# Altium footprint library Hare_Library.PcbLib: 252 footprints (part 5 of 16)
Each footprint in its own frame and in the unit in brackets; x right, y up, seen from the top. Pads: shape width x height; smd on the part's side, far side on the other; paste and mask are expansions set on the pad; w line width, h text height; cw(c..) or ccw(c..) is an arc to the next point about the centre after c.
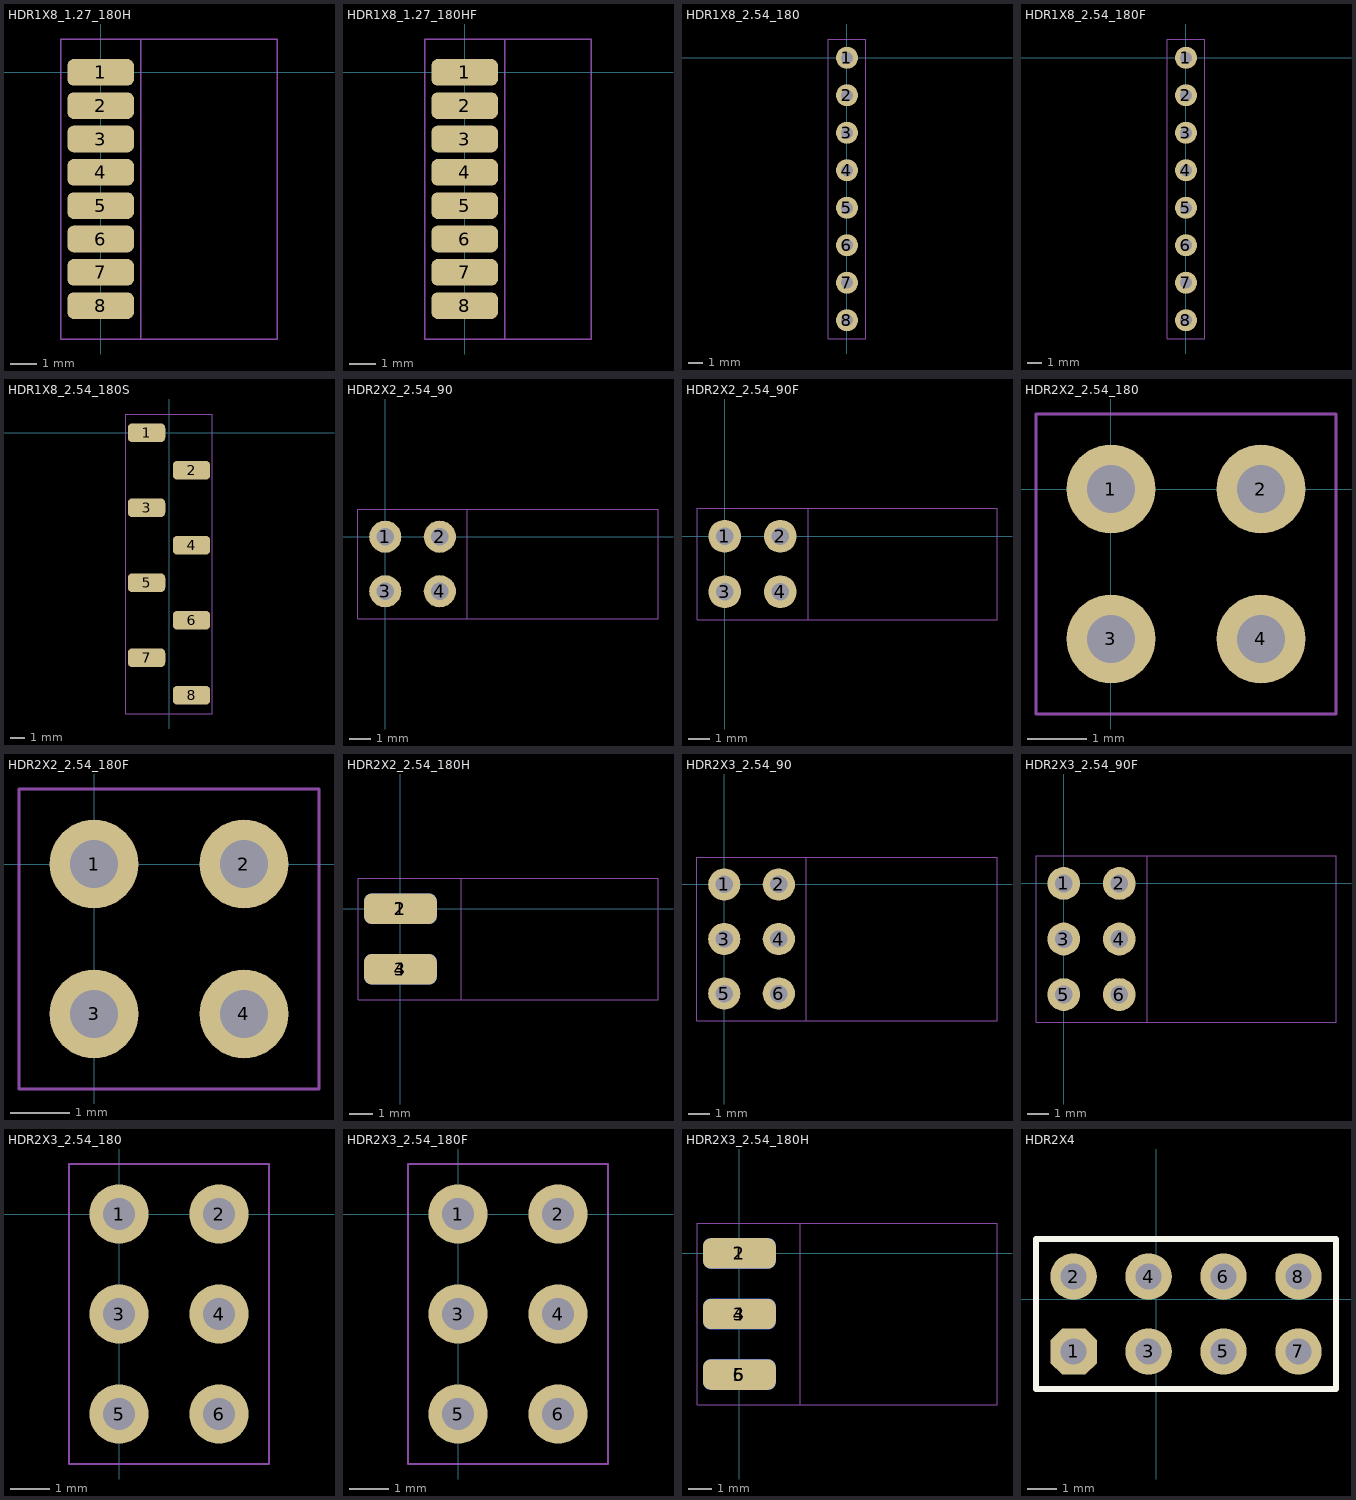
[diagram p4: the footprints below, top view; thin cyan lines are the x and y axes]

## HDR1X8_1.27_180H [mil]
height 169.29
pads (8):
  rrect50% 100x40 smd: 1(0,0) 2(0,-50) 3(0,-100) 4(0,-150) 5(0,-200) 6(0,-250) 7(0,-300) 8(0,-350)
Mechanical 13:
  lines w2: -60,-400 265,-400 265,50 -60,50 -60,-400
Mechanical 14:
  lines w2: -60,-400 60,-400 60,50 -60,50 -60,-400
3D body "pin_header_a-sl127-eg-g08d.stp": height 49.21, standoff -49.21, extent -47.36,-375 265.24,25

## HDR1X8_1.27_180HF [mil]
height 169.29
pads (8):
  rrect50% 100x40 smd: 1(0,0) 2(0,-50) 3(0,-100) 4(0,-150) 5(0,-200) 6(0,-250) 7(0,-300) 8(0,-350)
Mechanical 13:
  lines w2: -60,-400 -60,50 190,50 190,-400 -60,-400
Mechanical 14:
  lines w2: -60,-400 -60,50 60,50 60,-400 -60,-400
3D body "female_header_a-bl127-eg-z08d.stp": height 71.43, standoff 0.57, extent -39.48,-382.88 188.87,32.87

## HDR1X8_2.54_180 [mm]
height 4.3
pads (8):
  round 1.5 hole 0.813: 1(0,0) 2(0,-2.54) 3(0,-5.08) 4(0,-7.62) 5(0,-10.16) 6(0,-12.7) 7(0,-15.24) 8(0,-17.78)
Mechanical 13:
  lines w0.051: -1.27,-19.05 -1.27,1.27 1.27,1.27 1.27,-19.05 -1.27,-19.05
Mechanical 14:
  lines w0.051: -1.27,-19.05 1.27,-19.05 1.27,1.27 -1.27,1.27 -1.27,-19.05
3D body "pin_header_aw140-eg-g08d.stp": height 8.2, standoff -3, extent -1.249,-19.05 1.249,1.27

## HDR1X8_2.54_180F [mm]
height 4.3
pads (8):
  round 1.5 hole 0.813: 1(0,0) 2(0,-2.54) 3(0,-5.08) 4(0,-7.62) 5(0,-10.16) 6(0,-12.7) 7(0,-15.24) 8(0,-17.78)
Mechanical 13:
  lines w0.051: -1.27,-19.05 -1.27,1.27 1.27,1.27 1.27,-19.05 -1.27,-19.05
Mechanical 14:
  lines w0.051: -1.27,-19.05 -1.27,1.27 1.27,1.27 1.27,-19.05 -1.27,-19.05
3D body "female_header_a-bl254-eg-g08d.stp": height 8.5, standoff -3.2, extent -1.25,-19.173 1.25,1.397

## HDR1X8_2.54_180S [mil]
height 169.29
pads (8):
  rrect50% 100x50 smd: 1(-60,0) 2(60,-100) 3(-60,-200) 4(60,-300) 5(-60,-400) 6(60,-500) 7(-60,-600) 8(60,-700)
Mechanical 13:
  lines w2: -115,-750 -115,50 115,50 115,-750 -115,-750
Mechanical 14:
  lines w2: -115,-750 115,-750 115,50 -115,50 -115,-750
3D body "pin_header_a-sl254-eg-g08mp1.stp": height 386.46, standoff -0.94, extent -98.56,-746.06 98.29,53.94

## HDR2X2_2.54_90 [mm]
height 4.3
pads (4):
  round 1.5 hole 0.813: 1(0,0) 2(2.54,0) 3(0,-2.54) 4(2.54,-2.54)
Mechanical 13:
  lines w0.051: -1.27,-3.81 12.7,-3.81 12.7,1.27 -1.27,1.27 -1.27,-3.81
Mechanical 14:
  lines w0.051: -1.27,-3.81 3.81,-3.81 3.81,1.27 -1.27,1.27 -1.27,-3.81
3D body "pin_header_awl254-da-g04d.stp": height 5.04, standoff -2.96, extent -0.254,-3.81 12.626,1.27

## HDR2X2_2.54_90F [mm]
height 4.3
pads (4):
  round 1.5 hole 0.813: 1(0,0) 2(2.54,0) 3(0,-2.54) 4(2.54,-2.54)
Mechanical 13:
  lines w0.051: -1.27,-3.81 12.446,-3.81 12.446,1.27 -1.27,1.27 -1.27,-3.81
Mechanical 14:
  lines w0.051: -1.27,-3.81 -1.27,1.27 3.81,1.27 3.81,-3.81 -1.27,-3.81
3D body "female_header_a-bl254-da-g04d.stp": height 5.04, standoff -3.16, extent -0.254,-3.935 12.346,1.395

## HDR2X2_2.54_180 [mm]
height 4.3
pads (4):
  round 1.5 hole 0.813: 1(0,0) 2(2.54,0) 3(0,-2.54) 4(2.54,-2.54)
Mechanical 13:
  lines w0.051: -1.27,-3.81 -1.27,1.27 3.81,1.27 3.81,-3.81 -1.27,-3.81
Mechanical 14:
  lines w0.051: -1.27,-3.81 3.81,-3.81 3.81,1.27 -1.27,1.27 -1.27,-3.81
3D body "pin_header_awl254-dg-g04d.stp": height 8.5, standoff -3, extent -1.27,-3.81 3.81,1.27

## HDR2X2_2.54_180F [mm]
height 4.3
pads (4):
  round 1.5 hole 0.813: 1(0,0) 2(2.54,0) 3(0,-2.54) 4(2.54,-2.54)
Mechanical 13:
  lines w0.051: -1.27,-3.81 3.81,-3.81 3.81,1.27 -1.27,1.27 -1.27,-3.81
Mechanical 14:
  lines w0.051: -1.27,-3.81 -1.27,1.27 3.81,1.27 3.81,-3.81 -1.27,-3.81
3D body "female_header_a-bl254-dg-g04d.stp": height 8.5, standoff -3.2, extent -1.23,-3.935 3.77,1.395

## HDR2X2_2.54_180H [mil]
height 169.29
pads (4):
  rrect50% 120x50 smd: 1(0,0) 3(0,-100)
  rrect50% 120x50 smd far side: 2(0,0) 4(0,-100)
Mechanical 13:
  lines w2: -70,-150 -70,50 425,50 425,-150 -70,-150
Mechanical 14:
  lines w2: -70,-150 -70,50 100,50 100,-150 -70,-150
Mechanical 15:
  lines w2: -70,-150 -70,50 100,50 100,-150 -70,-150
3D body "pin_header_awl254-dg-g04d.stp": height 78, standoff -122, extent -38.11,-149.99 414.65,50.01

## HDR2X3_2.54_90 [mm]
height 4.3
pads (6):
  round 1.5 hole 0.813: 1(0,0) 2(2.54,0) 3(0,-2.54) 4(2.54,-2.54) 5(0,-5.08) 6(2.54,-5.08)
Mechanical 13:
  lines w0.051: -1.27,-6.35 12.7,-6.35 12.7,1.27 -1.27,1.27 -1.27,-6.35
Mechanical 14:
  lines w0.051: -1.27,-6.35 -1.27,1.27 3.81,1.27 3.81,-6.35 -1.27,-6.35
3D body "pin_header_awl254-da-g06d.stp": height 5.04, standoff -2.96, extent -0.254,-6.35 12.626,1.27

## HDR2X3_2.54_90F [mm]
height 4.3
pads (6):
  round 1.5 hole 0.813: 1(0,0) 2(2.54,0) 3(0,-2.54) 4(2.54,-2.54) 5(0,-5.08) 6(2.54,-5.08)
Mechanical 13:
  lines w0.051: -1.27,-6.35 -1.27,1.27 12.446,1.27 12.446,-6.35 -1.27,-6.35
Mechanical 14:
  lines w0.051: -1.27,-6.35 -1.27,1.27 3.81,1.27 3.81,-6.35 -1.27,-6.35
3D body "female_header_a-bl254-da-g06d.stp": height 5.04, standoff -3.16, extent -0.254,-6.475 12.346,1.395

## HDR2X3_2.54_180 [mm]
height 4.3
pads (6):
  round 1.5 hole 0.813: 1(0,0) 2(2.54,0) 3(0,-2.54) 4(2.54,-2.54) 5(0,-5.08) 6(2.54,-5.08)
Mechanical 13:
  lines w0.051: -1.27,-6.35 3.81,-6.35 3.81,1.27 -1.27,1.27 -1.27,-6.35
Mechanical 14:
  lines w0.051: -1.27,-6.35 3.81,-6.35 3.81,1.27 -1.27,1.27 -1.27,-6.35
3D body "pin_header_awl254-dg-g06d.stp": height 8.5, standoff -3, extent -1.27,-6.35 3.81,1.27

## HDR2X3_2.54_180F [mm]
height 4.3
pads (6):
  round 1.5 hole 0.813: 1(0,0) 2(2.54,0) 3(0,-2.54) 4(2.54,-2.54) 5(0,-5.08) 6(2.54,-5.08)
Mechanical 13:
  lines w0.051: -1.27,-6.35 -1.27,1.27 3.81,1.27 3.81,-6.35 -1.27,-6.35
Mechanical 14:
  lines w0.051: -1.27,-6.35 -1.27,1.27 3.81,1.27 3.81,-6.35 -1.27,-6.35
3D body "female_header_a-bl254-dg-g06d.stp": height 8.5, standoff -3.2, extent -1.23,-6.475 3.77,1.395

## HDR2X3_2.54_180H [mil]
height 169.29
pads (6):
  rrect50% 120x50 smd: 1(0,0) 3(0,-100) 5(0,-200)
  rrect50% 120x50 smd far side: 2(0,0) 4(0,-100) 6(0,-200)
Mechanical 13:
  lines w2: -70,-250 425,-250 425,50 -70,50 -70,-250
Mechanical 14:
  lines w2: -70,-250 100,-250 100,50 -70,50 -70,-250
Mechanical 15:
  lines w2: -70,-250 100,-250 100,50 -70,50 -70,-250
3D body "pin_header_awl254-dg-g06d.stp": height 78, standoff -122, extent -38.11,-249.99 414.65,50.01

## HDR2X4 [mil]
pads (8):
  oct 62x62 hole 35: 1(-110,-70)
  round 62 hole 35: 2(-110,30) 3(-10,-70) 4(-10,30) 5(90,-70) 6(90,30) 7(190,-70) 8(190,30)
Top Overlay:
  lines w8: -160,-120 240,-120 240,80 -160,80 -160,-120
3D body "User Library-1x2 TH Pitch 2_54mm.SLDPRT": height 373.85, standoff -125.98, extent -160,-120 -60,80
3D body "User Library-1x2 TH Pitch 2_54mm.SLDPRT": height 373.85, standoff -125.98, extent -60,-120 40,80
3D body "User Library-1x2 TH Pitch 2_54mm.SLDPRT": height 373.85, standoff -125.98, extent 40,-120 140,80
3D body "User Library-1x2 TH Pitch 2_54mm.SLDPRT": height 373.85, standoff -125.98, extent 140,-120 240,80